# Altium footprint library THU VIEN V1.PcbLib: 400 footprints (part 8 of 25)
Each footprint in its own frame and in the unit in brackets; x right, y up, seen from the top. Pads: shape width x height; smd on the part's side, far side on the other; paste and mask are expansions set on the pad; w line width, h text height; cw(c..) or ccw(c..) is an arc to the next point about the centre after c.
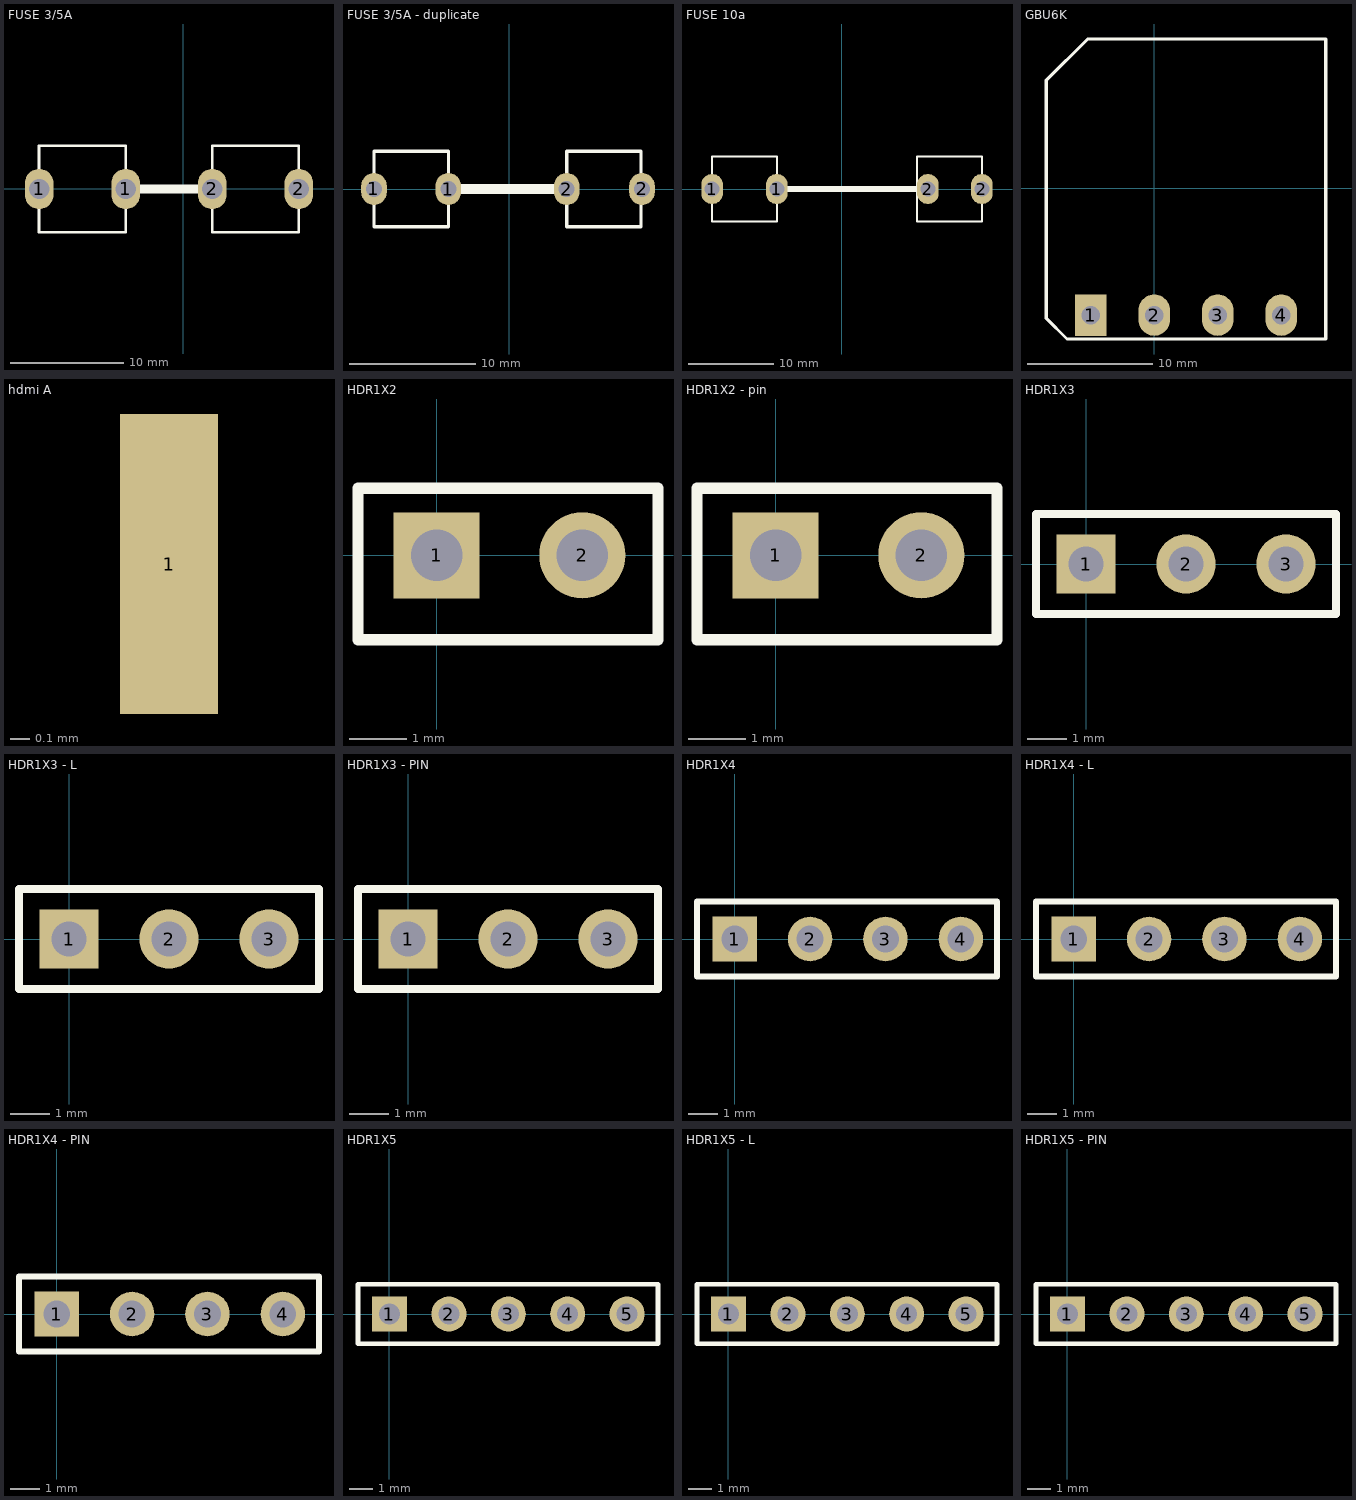
[diagram p7: the footprints below, top view; thin cyan lines are the x and y axes]

## FUSE 3/5A [mil]
pads (4):
  oval 100x140 hole 70: 1(-500,0) 1(-200,0) 2(100,0) 2(400,0)
Top Overlay:
  lines w10: -500,-150 -500,150 -200,150 -200,-150 -500,-150 ; 100,-150 100,150 400,150 400,-150 100,-150
  lines w30: -150,0 50,0
3D body: height 448.43, standoff 251.57, extent -443.69,-98.42 343.71,98.43
3D body: height 431.53, standoff -136.22, extent 139.69,-151.63 360.32,151.64
3D body: height 477.88, standoff -29.94, extent -469.99,-121.85 -229.99,121.86

## FUSE 3/5A - duplicate [mil]
pads (4):
  oval 80x100 hole 50: 1(-422.44,0) 1(-190,0) 2(180,0) 2(415.28,0)
Top Overlay:
  lines w10: -422.44,-118.11 -190,-118.11 -190,118.11 -422.44,118.11 -422.44,-118.11 ; 180,-118.11 412.2,-118.11 412.2,118.11 180,118.11 180,-118.11
  lines w30: -170,0 200,0
3D body: height 375.66, standoff -132.16, extent -422.44,-121.85 415.28,121.86

## FUSE 10a [mil]
pads (4):
  oval 100x140 hole 70: 1(-600,0) 1(-300,0) 2(400,0) 2(650,0)
Top Overlay:
  lines w10: -600,-150 -300,-150 -300,150 -600,150 -600,-150 ; 350,-150 650,-150 650,150 350,150 350,-150
  lines w30: -300,0 400,0
3D body: height 348.03, standoff -157.76, extent -582.87,-116.23 632.88,116.24

## GBU6K [mm]
pads (4):
  rect 2.54x3.302 hole 1.5: 1(-5.08,-10.16)
  oval 2.54x3.302 hole 1.5: 2(0,-10.16) 3(5.08,-10.16) 4(10.16,-10.16)
Top Overlay:
  lines w0.254: -8.636,-10.414 -8.636,8.636 -5.334,11.938 13.716,11.938 13.716,-12.065 -6.985,-12.065 -8.636,-10.414
3D body: height 3.81, standoff -12.34, extent -8.61,-10.414 13.69,11.886

## hdmi A [mil]
pads (1):
  rect 19.68x60 smd: 1(-170,130)
3D body: height 227.36, standoff -87.57, extent -279.52,-257.87 358.27,131.9

## HDR1X2 [mm] "Connector; Header; 2 Position"
pads (2):
  rect 1.5x1.5 hole 0.9: 1(0,0)
  round 1.5 hole 0.9: 2(2.54,0)
Top Overlay:
  lines w0.2: -1.372,-1.473 3.861,-1.473 3.861,1.168 -1.372,1.168 -1.372,-1.473
3D body: height 8.55, standoff -2.43, extent -1.31,-1.263 3.77,1.277

## HDR1X2 - pin [mm] "Connector; Header; 2 Position"
pads (2):
  rect 1.5x1.5 hole 0.9: 1(0,0)
  round 1.5 hole 0.9: 2(2.54,0)
Top Overlay:
  lines w0.2: -1.372,-1.473 -1.372,1.168 3.861,1.168 3.861,-1.473 -1.372,-1.473
3D body: height 6.02, standoff -3.1, extent -1.27,-1.295 3.81,1.245

## HDR1X3 [mm] "Connector; Header; 3 Position"
pads (3):
  rect 1.5x1.5 hole 0.9: 1(0,0)
  round 1.5 hole 0.9: 2(2.54,0) 3(5.08,0)
Top Overlay:
  lines w0.2: -1.27,-1.27 6.35,-1.27 6.35,1.27 -1.27,1.27 -1.27,-1.27

## HDR1X3 - L [mm] "Connector; Header; 3 Position"
pads (3):
  rect 1.5x1.5 hole 0.9: 1(0,0)
  round 1.5 hole 0.9: 2(2.54,0) 3(5.08,0)
Top Overlay:
  lines w0.2: -1.27,-1.27 -1.27,1.27 6.35,1.27 6.35,-1.27 -1.27,-1.27
3D body: height 4.33, standoff -3, extent -1.27,-1.27 6.35,7

## HDR1X3 - PIN [mm] "Connector; Header; 3 Position"
pads (3):
  rect 1.5x1.5 hole 0.9: 1(0,0)
  round 1.5 hole 0.9: 2(2.54,0) 3(5.08,0)
Top Overlay:
  lines w0.2: -1.27,-1.27 6.35,-1.27 6.35,1.27 -1.27,1.27 -1.27,-1.27
3D body: height 6.02, standoff -3.1, extent -1.27,-1.245 6.35,1.295

## HDR1X4 [mm] "Connector; Header; 4 Position"
pads (4):
  rect 1.5x1.5 hole 0.9: 1(0,0)
  round 1.5 hole 0.9: 2(2.54,0) 3(5.08,0) 4(7.62,0)
Top Overlay:
  lines w0.2: -1.27,-1.27 -1.27,1.27 8.839,1.27 8.839,-1.27 -1.27,-1.27
3D body: height 8.55, standoff -2.43, extent 3.632,-1.245 8.712,1.295
3D body: height 8.55, standoff -2.43, extent -1.219,-1.245 3.861,1.295

## HDR1X4 - L [mm] "Connector; Header; 4 Position"
pads (4):
  rect 1.5x1.5 hole 0.9: 1(0,0)
  round 1.5 hole 0.9: 2(2.54,0) 3(5.08,0) 4(7.62,0)
Top Overlay:
  lines w0.2: -1.27,-1.27 8.839,-1.27 8.839,1.27 -1.27,1.27 -1.27,-1.27
3D body: height 4.33, standoff -3, extent -1.295,-7 8.865,1.27

## HDR1X4 - PIN [mm] "Connector; Header; 4 Position"
pads (4):
  rect 1.5x1.5 hole 0.9: 1(0,0)
  round 1.5 hole 0.9: 2(2.54,0) 3(5.08,0) 4(7.62,0)
Top Overlay:
  lines w0.2: -1.27,-1.27 8.839,-1.27 8.839,1.27 -1.27,1.27 -1.27,-1.27
3D body: height 6.02, standoff -3.1, extent -1.27,-1.295 8.89,1.245

## HDR1X5 [mm] "Connector; Header; 5 Position"
pads (5):
  rect 1.5x1.5 hole 0.9: 1(0,0)
  round 1.5 hole 0.9: 2(2.54,0) 3(5.08,0) 4(7.62,0) 5(10.16,0)
Top Overlay:
  lines w0.2: -1.346,-1.27 11.481,-1.27 11.481,1.27 -1.346,1.27 -1.346,-1.27
3D body: height 8.52, standoff -2.48, extent -1.27,-1.25 11.43,1.25

## HDR1X5 - L [mm] "Connector; Header; 5 Position"
pads (5):
  rect 1.5x1.5 hole 0.9: 1(0,0)
  round 1.5 hole 0.9: 2(2.54,0) 3(5.08,0) 4(7.62,0) 5(10.16,0)
Top Overlay:
  lines w0.2: -1.346,-1.27 -1.346,1.27 11.481,1.27 11.481,-1.27 -1.346,-1.27
3D body: height 4.33, standoff -3, extent -1.27,-1.27 11.43,7

## HDR1X5 - PIN [mm] "Connector; Header; 5 Position"
pads (5):
  rect 1.5x1.5 hole 0.9: 1(0,0)
  round 1.5 hole 0.9: 2(2.54,0) 3(5.08,0) 4(7.62,0) 5(10.16,0)
Top Overlay:
  lines w0.2: -1.346,-1.27 11.481,-1.27 11.481,1.27 -1.346,1.27 -1.346,-1.27
3D body: height 6.02, standoff -3.1, extent -1.295,-1.245 3.785,1.295
3D body: height 6.02, standoff -3.1, extent 3.785,-1.245 11.405,1.295